# Altium schematic symbol library FPGA_Xilinx_Virtex6.SchLib: 28 symbols (part 14 of 21)
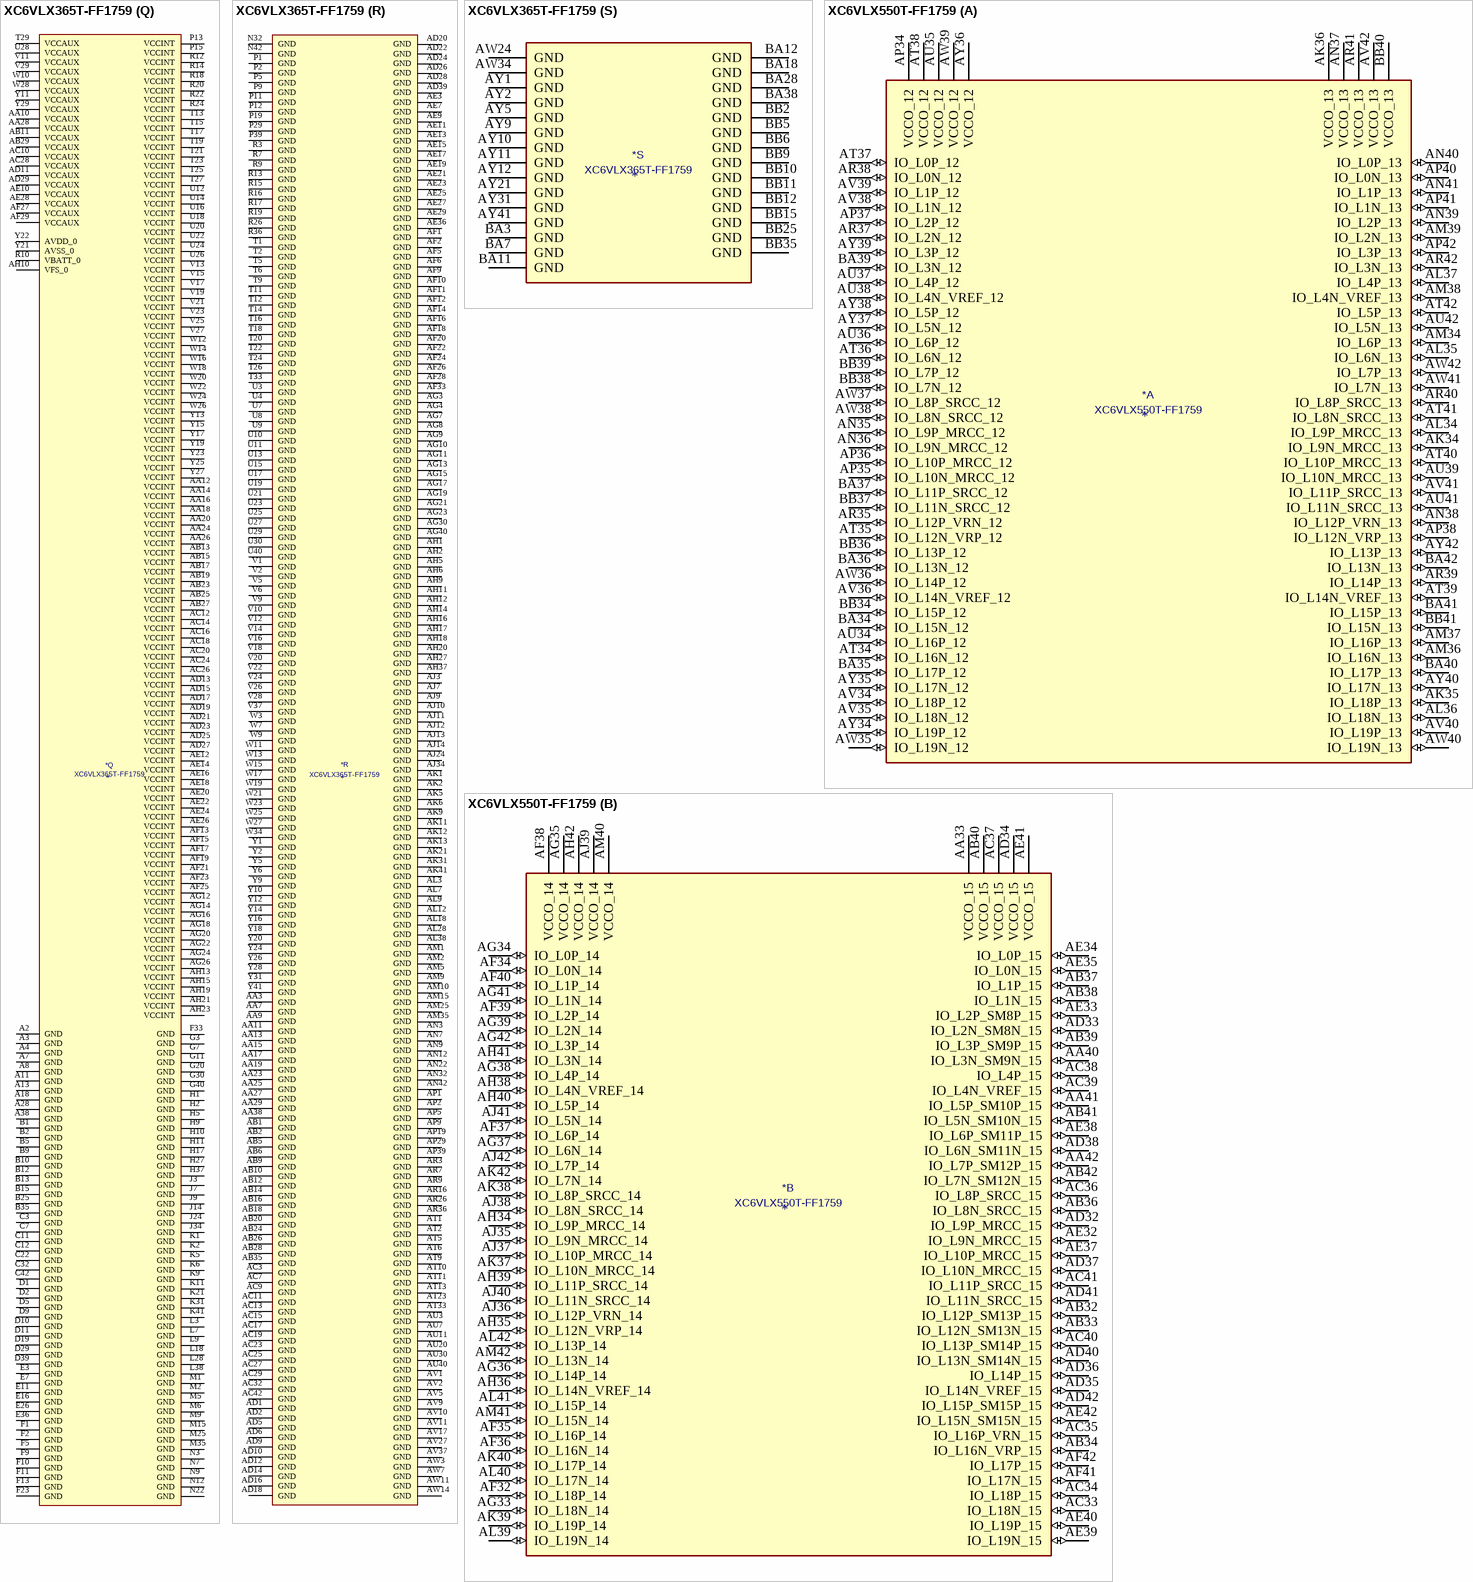
[diagram p114: symbols XC6VLX365T-FF1759 to XC6VLX550T-FF1759]

## XC6VLX365T-FF1759
designator *  value XC6VLX365T-FF1759
ki_keywords: FPGA; ki_description: Virtex 6 LXT 365 XC6VLX365T-FF1759
part A pins: AK34 IO_L9N_MRCC_13 (io), AK35 IO_L18P_13 (io), AK36 VCCO_13 (power), AL34 IO_L9P_MRCC_13 (io), AL35 IO_L6N_13 (io), AL36 IO_L18N_13 (io), AL37 IO_L4P_13 (io), AM34 IO_L6P_13 (io), AM36 IO_L16N_13 (io), AM37 IO_L16P_13 (io), AM38 IO_L4N_VREF_13 (io), AM39 IO_L2N_13 (io), AN35 IO_L9P_MRCC_12 (io), AN36 IO_L9N_MRCC_12 (io), AN37 VCCO_13 (power), AN38 IO_L12P_VRN_13 (io), AN39 IO_L2P_13 (io), AN40 IO_L0P_13 (io), AN41 IO_L1P_13 (io), AP34 VCCO_12 (power), AP35 IO_L10N_MRCC_12 (io), AP36 IO_L10P_MRCC_12 (io), AP37 IO_L2P_12 (io), AP38 IO_L12N_VRP_13 (io), AP40 IO_L0N_13 (io), AP41 IO_L1N_13 (io), AP42 IO_L3P_13 (io), AR35 IO_L12P_VRN_12 (io), AR37 IO_L2N_12 (io), AR38 IO_L0N_12 (io), AR39 IO_L14P_13 (io), AR40 IO_L8P_SRCC_13 (io), AR41 VCCO_13 (power), AR42 IO_L3N_13 (io), AT34 IO_L16N_12 (io), AT35 IO_L12N_VRP_12 (io), AT36 IO_L6N_12 (io), AT37 IO_L0P_12 (io), AT38 VCCO_12 (power), AT39 IO_L14N_VREF_13 (io), AT40 IO_L10P_MRCC_13 (io), AT41 IO_L8N_SRCC_13 (io), AT42 IO_L5P_13 (io), AU34 IO_L16P_12 (io), AU35 VCCO_12 (power), AU36 IO_L6P_12 (io), AU37 IO_L4P_12 (io), AU38 IO_L4N_VREF_12 (io), AU39 IO_L10N_MRCC_13 (io), AU41 IO_L11N_SRCC_13 (io), AU42 IO_L5N_13 (io), AV34 IO_L18P_12 (io), AV35 IO_L18N_12 (io), AV36 IO_L14N_VREF_12 (io), AV38 IO_L1N_12 (io), AV39 IO_L1P_12 (io), AV40 IO_L19P_13 (io), AV41 IO_L11P_SRCC_13 (io), AV42 VCCO_13 (power), AW35 IO_L19N_12 (io), AW36 IO_L14P_12 (io), AW37 IO_L8P_SRCC_12 (io), AW38 IO_L8N_SRCC_12 (io), AW39 VCCO_12 (power), AW40 IO_L19N_13 (io), AW41 IO_L7N_13 (io), AW42 IO_L7P_13 (io), AY34 IO_L19P_12 (io), AY35 IO_L17N_12 (io), AY36 VCCO_12 (power), AY37 IO_L5N_12 (io), AY38 IO_L5P_12 (io), AY39 IO_L3P_12 (io), AY40 IO_L17N_13 (io), AY42 IO_L13P_13 (io), BA34 IO_L15N_12 (io), BA35 IO_L17P_12 (io), BA36 IO_L13N_12 (io), BA37 IO_L11P_SRCC_12 (io), BA39 IO_L3N_12 (io), BA40 IO_L17P_13 (io), BA41 IO_L15P_13 (io), BA42 IO_L13N_13 (io), BB34 IO_L15P_12 (io), BB36 IO_L13P_12 (io), BB37 IO_L11N_SRCC_12 (io), BB38 IO_L7N_12 (io), BB39 IO_L7P_12 (io), BB40 VCCO_13 (power), BB41 IO_L15N_13 (io)
part B pins: AA33 VCCO_15 (power), AA40 IO_L3N_SM9N_15 (io), AA41 IO_L5P_SM10P_15 (io), AA42 IO_L7P_SM12P_15 (io), AB32 IO_L12P_SM13P_15 (io), AB33 IO_L12N_SM13N_15 (io), AB34 IO_L16N_VRP_15 (io), AB36 IO_L8N_SRCC_15 (io), AB37 IO_L1P_15 (io), AB38 IO_L1N_15 (io), AB39 IO_L3P_SM9P_15 (io), AB40 VCCO_15 (power), AB41 IO_L5N_SM10N_15 (io), AB42 IO_L7N_SM12N_15 (io), AC33 IO_L18N_15 (io), AC34 IO_L18P_15 (io), AC35 IO_L16P_VRN_15 (io), AC36 IO_L8P_SRCC_15 (io), AC37 VCCO_15 (power), AC38 IO_L4P_15 (io), AC39 IO_L4N_VREF_15 (io), AC40 IO_L13P_SM14P_15 (io), AC41 IO_L11P_SRCC_15 (io), AD32 IO_L9P_MRCC_15 (io), AD33 IO_L2N_SM8N_15 (io), AD34 VCCO_15 (power), AD35 IO_L14N_VREF_15 (io), AD36 IO_L14P_15 (io), AD37 IO_L10N_MRCC_15 (io), AD38 IO_L6N_SM11N_15 (io), AD40 IO_L13N_SM14N_15 (io), AD41 IO_L11N_SRCC_15 (io), AD42 IO_L15P_SM15P_15 (io), AE32 IO_L9N_MRCC_15 (io), AE33 IO_L2P_SM8P_15 (io), AE34 IO_L0P_15 (io), AE35 IO_L0N_15 (io), AE37 IO_L10P_MRCC_15 (io), AE38 IO_L6P_SM11P_15 (io), AE39 IO_L19N_15 (io), AE40 IO_L19P_15 (io), AE41 VCCO_15 (power), AE42 IO_L15N_SM15N_15 (io), AF32 IO_L18P_14 (io), AF34 IO_L0N_14 (io), AF35 IO_L16P_14 (io), AF36 IO_L16N_14 (io), AF37 IO_L6P_14 (io), AF38 VCCO_14 (power), AF39 IO_L2P_14 (io), AF40 IO_L1P_14 (io), AF41 IO_L17N_15 (io), AF42 IO_L17P_15 (io), AG33 IO_L18N_14 (io), AG34 IO_L0P_14 (io), AG35 VCCO_14 (power), AG36 IO_L14P_14 (io), AG37 IO_L6N_14 (io), AG38 IO_L4P_14 (io), AG39 IO_L2N_14 (io), AG41 IO_L1N_14 (io), AG42 IO_L3P_14 (io), AH34 IO_L9P_MRCC_14 (io), AH35 IO_L12N_VRP_14 (io), AH36 IO_L14N_VREF_14 (io), AH38 IO_L4N_VREF_14 (io), AH39 IO_L11P_SRCC_14 (io), AH40 IO_L5P_14 (io), AH41 IO_L3N_14 (io), AH42 VCCO_14 (power), AJ35 IO_L9N_MRCC_14 (io), AJ36 IO_L12P_VRN_14 (io), AJ37 IO_L10P_MRCC_14 (io), AJ38 IO_L8N_SRCC_14 (io), AJ39 VCCO_14 (power), AJ40 IO_L11N_SRCC_14 (io), AJ41 IO_L5N_14 (io), AJ42 IO_L7P_14 (io), AK37 IO_L10N_MRCC_14 (io), AK38 IO_L8P_SRCC_14 (io), AK39 IO_L19P_14 (io), AK40 IO_L17P_14 (io), AK42 IO_L7N_14 (io), AL39 IO_L19N_14 (io), AL40 IO_L17N_14 (io), AL41 IO_L15P_14 (io), AL42 IO_L13P_14 (io), AM40 VCCO_14 (power), AM41 IO_L15N_14 (io), AM42 IO_L13N_14 (io)
part C pins: AA32 IO_L12P_VRN_16 (io), AA34 IO_L14P_16 (io), AA35 IO_L8P_SRCC_16 (io), AA36 IO_L4P_16 (io), AA37 IO_L4N_VREF_16 (io), AA39 IO_L19N_16 (io), L39 IO_L1P_17 (io), L40 IO_L1N_17 (io), L41 IO_L3P_17 (io), L42 IO_L3N_17 (io), M36 IO_L0P_17 (io), M37 IO_L0N_17 (io), M38 IO_L2P_17 (io), M39 IO_L2N_17 (io), M40 VCCO_17 (power), M41 IO_L7P_17 (io), M42 IO_L7N_17 (io), N34 IO_L4N_VREF_17 (io), N35 IO_L4P_17 (io), N36 IO_L6P_17 (io), N37 VCCO_17 (power), N38 IO_L5P_17 (io), N39 IO_L5N_17 (io), N40 IO_L11P_SRCC_17 (io), N41 IO_L11N_SRCC_17 (io), P34 VCCO_17 (power), P35 IO_L9N_MRCC_17 (io), P36 IO_L9P_MRCC_17 (io), P37 IO_L6N_17 (io), P38 IO_L8N_SRCC_17 (io), P40 IO_L13P_17 (io), P41 IO_L13N_17 (io), P42 IO_L15P_17 (io), R34 IO_L14N_VREF_17 (io), R35 IO_L14P_17 (io), R37 IO_L12P_VRN_17 (io), R38 IO_L10N_MRCC_17 (io), R39 IO_L8P_SRCC_17 (io), R40 IO_L17P_17 (io), R41 VCCO_17 (power), R42 IO_L15N_17 (io), T34 IO_L18P_17 (io), T35 IO_L18N_17 (io), T36 IO_L16N_17 (io), T37 IO_L12N_VRP_17 (io), T38 VCCO_17 (power), T39 IO_L10P_MRCC_17 (io), T40 IO_L17N_17 (io), T41 IO_L19P_17 (io), T42 IO_L19N_17 (io), U32 IO_L16P_16 (io), U33 IO_L16N_16 (io), U34 IO_L10N_MRCC_16 (io), U35 VCCO_16 (power), U36 IO_L16P_17 (io), U37 IO_L1P_16 (io), U38 IO_L1N_16 (io), U39 IO_L5P_16 (io), U41 IO_L3N_16 (io), U42 IO_L3P_16 (io), V32 VCCO_16 (power), V33 IO_L18P_16 (io), V34 IO_L10P_MRCC_16 (io), V35 IO_L6N_16 (io), V36 IO_L2N_16 (io), V38 IO_L7P_16 (io), V39 IO_L5N_16 (io), V40 IO_L11P_SRCC_16 (io), V41 IO_L13P_16 (io), V42 VCCO_16 (power), W32 IO_L9P_MRCC_16 (io), W33 IO_L18N_16 (io), W35 IO_L6P_16 (io), W36 IO_L2P_16 (io), W37 IO_L0P_16 (io), W38 IO_L7N_16 (io), W39 VCCO_16 (power), W40 IO_L11N_SRCC_16 (io), W41 IO_L13N_16 (io), W42 IO_L15P_16 (io), Y32 IO_L12N_VRP_16 (io), Y33 IO_L9N_MRCC_16 (io), Y34 IO_L14N_VREF_16 (io), Y35 IO_L8N_SRCC_16 (io), Y36 VCCO_16 (power), Y37 IO_L0N_16 (io), Y38 IO_L19P_16 (io), Y39 IO_L17N_16 (io), Y40 IO_L17P_16 (io), Y42 IO_L15N_16 (io)
part D pins: AH22 VCCO_21 (power), AL23 VCCO_21 (power), AL26 IO_L9N_MRCC_22 (io), AM26 IO_L9P_MRCC_22 (io), AM27 IO_L10N_MRCC_22 (io), AN26 IO_L1P_22 (io), AN27 VCCO_22 (power), AN28 IO_L10P_MRCC_22 (io), AP24 VCCO_21 (power), AP27 IO_L1N_22 (io), AP28 IO_L3N_22 (io), AR27 IO_L11P_SRCC_22 (io), AR28 IO_L3P_22 (io), AR29 IO_L5N_22 (io), AR30 IO_L7N_22 (io), AT27 IO_L11N_SRCC_22 (io), AT28 VCCO_22 (power), AT29 IO_L5P_22 (io), AT30 IO_L7P_22 (io), AT31 IO_L13P_22 (io), AU25 VCCO_21 (power), AU28 IO_L17P_22 (io), AU29 IO_L15P_22 (io), AU31 IO_L13N_22 (io), AV28 IO_L17N_22 (io), AV29 IO_L15N_22 (io), AV30 IO_L0N_22 (io), AV31 IO_L2N_22 (io), AW28 IO_L19P_22 (io), AW29 VCCO_22 (power), AW30 IO_L0P_22 (io), AW31 IO_L2P_22 (io), AW32 IO_L4N_VREF_22 (io), AY26 VCCO_21 (power), AY28 IO_L19N_22 (io), AY29 IO_L12P_VRN_22 (io), AY30 IO_L8N_SRCC_22 (io), AY32 IO_L4P_22 (io), AY33 IO_L6N_22 (io), BA29 IO_L12N_VRP_22 (io), BA30 IO_L8P_SRCC_22 (io), BA31 IO_L16P_22 (io), BA32 IO_L6P_22 (io), BA33 VCCO_22 (power), BB28 IO_L18N_22 (io), BB29 IO_L18P_22 (io), BB30 VCCO_22 (power), BB31 IO_L16N_22 (io), BB32 IO_L14N_VREF_22 (io), BB33 IO_L14P_22 (io)
part E pins: AA30 IO_L9N_MRCC_24 (io), AA31 IO_L10P_MRCC_24 (io), AB30 VCCO_24 (power), AB31 IO_L10N_MRCC_24 (io), AC30 IO_L17N_VRP_24 (io), AC31 IO_L17P_VRN_24 (io), AD30 IO_L19N_24 (io), AD31 IO_L19P_24 (io), AE30 IO_L0P_GC_24 (io), AE31 VCCO_24 (power), AF30 IO_L0N_GC_24 (io), AF31 IO_L2N_D14_24 (io), AG25 VCCO_23 (power), AG27 IO_L14N_VREF_23 (io), AG28 IO_L14P_23 (io), AG29 IO_L18N_24 (io), AG31 IO_L4N_VREF_D10_24 (io), AG32 IO_L2P_D15_24 (io), AH24 IO_L10P_MRCC_23 (io), AH25 IO_L10N_MRCC_23 (io), AH26 IO_L18N_23 (io), AH28 IO_L12P_VRN_23 (io), AH29 IO_L18P_24 (io), AH30 IO_L14P_FCS_B_24 (io), AH31 IO_L4P_D11_24 (io), AH32 VCCO_24 (power), AH33 IO_L6N_D6_24 (io), AJ25 IO_L9P_MRCC_23 (io), AJ26 IO_L18P_23 (io), AJ27 IO_L16N_23 (io), AJ28 IO_L12N_VRP_23 (io), AJ29 VCCO_24 (power), AJ30 IO_L14N_VREF_FOE_B_MOSI_24 (io), AJ31 IO_L16P_RS0_24 (io), AJ32 IO_L8N_SRCC_24 (io), AJ33 IO_L6P_D7_24 (io), AK25 IO_L9N_MRCC_23 (io), AK26 VCCO_23 (power), AK27 IO_L16P_23 (io), AK28 IO_L8P_SRCC_23 (io), AK29 IO_L8N_SRCC_23 (io), AK30 IO_L16N_CSO_B_24 (io), AK32 IO_L12P_D3_24 (io), AK33 IO_L8P_SRCC_24 (io), AL27 IO_L6P_23 (io), AL29 IO_L2P_23 (io), AL30 IO_L2N_23 (io), AL31 IO_L1N_23 (io), AL32 IO_L12N_D2_FS2_24 (io), AL33 VCCO_23 (power), AM28 IO_L6N_23 (io), AM29 IO_L4N_VREF_23 (io), AM30 VCCO_23 (power), AM31 IO_L1P_23 (io), AM32 IO_L3N_23 (io), AM33 IO_L3P_23 (io), AN29 IO_L4P_23 (io), AN30 IO_L0N_23 (io), AN31 IO_L7N_23 (io), AN33 IO_L5P_23 (io), AN34 IO_L5N_23 (io), AP30 IO_L0P_23 (io), AP31 IO_L7P_23 (io), AP32 IO_L13P_23 (io), AP33 IO_L11N_SRCC_23 (io), AR31 VCCO_23 (power), AR32 IO_L13N_23 (io), AR33 IO_L15P_23 (io), AR34 IO_L11P_SRCC_23 (io), AT32 IO_L15N_23 (io), AU32 IO_L17N_23 (io), AU33 IO_L17P_23 (io), AV32 VCCO_23 (power), AV33 IO_L19P_23 (io), AW33 IO_L19N_23 (io), N33 IO_L5P_D9_24 (io), P32 IO_L7P_D5_24 (io), P33 IO_L5N_D8_24 (io), R30 IO_L3N_D12_24 (io), R31 VCCO_24 (power), R32 IO_L11P_SRCC_24 (io), R33 IO_L7N_D4_24 (io), T30 IO_L3P_D13_24 (io), T31 IO_L13P_D1_FS1_24 (io), T32 IO_L11N_SRCC_24 (io), U31 IO_L13N_D0_FS0_24 (io), V30 IO_L1N_GC_24 (io), V31 IO_L15P_FWE_B_24 (io), W29 VCCO_24 (power), W30 IO_L1P_GC_24 (io), W31 IO_L15N_RS1_24 (io), Y30 IO_L9P_MRCC_24 (io)
part F pins: A37 IO_L1N_26 (io), A39 IO_L3N_26 (io), A40 IO_L7P_26 (io), A41 IO_L7N_26 (io), B37 IO_L1P_26 (io), B38 IO_L3P_26 (io), B39 IO_L5P_26 (io), B40 VCCO_26 (power), B41 IO_L11P_SRCC_26 (io), B42 IO_L11N_SRCC_26 (io), C37 VCCO_26 (power), C38 IO_L6N_26 (io), C39 IO_L5N_26 (io), C40 IO_L13P_26 (io), C41 IO_L13N_26 (io), D38 IO_L6P_26 (io), D40 IO_L17P_26 (io), D41 IO_L15N_26 (io), D42 IO_L15P_26 (io), E37 IO_L4N_VREF_26 (io), E38 IO_L8N_SRCC_26 (io), E39 IO_L8P_SRCC_26 (io), E40 IO_L17N_26 (io), E41 VCCO_26 (power), E42 IO_L19P_26 (io), F35 IO_L10P_MRCC_26 (io), F36 IO_L10N_MRCC_26 (io), F37 IO_L4P_26 (io), F38 VCCO_26 (power), F39 IO_L12P_VRN_26 (io), F40 IO_L16P_26 (io), F41 IO_L16N_26 (io), F42 IO_L19N_26 (io), G34 IO_L9P_MRCC_26 (io), G35 VCCO_26 (power), G36 IO_L0N_26 (io), G37 IO_L14P_26 (io), G38 IO_L14N_VREF_26 (io), G39 IO_L12N_VRP_26 (io), G41 IO_L18P_26 (io), G42 IO_L18N_26 (io), H34 IO_L9N_MRCC_26 (io), H35 IO_L2N_26 (io), H36 IO_L0P_26 (io), H38 IO_L6N_25 (io), H39 IO_L6P_25 (io), H40 IO_L12P_25 (io), H41 IO_L12N_25 (io), H42 VCCO_25 (power), J35 IO_L2P_26 (io), J36 IO_L4N_VREF_25 (io), J37 IO_L4P_25 (io), J38 IO_L8N_SRCC_25 (io), J39 VCCO_25 (power), J40 IO_L14P_25 (io), J41 IO_L14N_VREF_25 (io), J42 IO_L18P_GC_25 (io), K32 IO_L0N_25 (io), K33 IO_L0P_25 (io), K34 IO_L2N_25 (io), K35 IO_L2P_25 (io), K36 VCCO_25 (power), K37 IO_L11P_SRCC_25 (io), K38 IO_L8P_SRCC_25 (io), K39 IO_L16P_VRN_25 (io), K40 IO_L16N_VRP_25 (io), K42 IO_L18N_GC_25 (io), L31 IO_L3P_25 (io), L32 IO_L3N_25 (io), L33 VCCO_25 (power), L34 IO_L13P_25 (io), L35 IO_L7P_25 (io), L36 IO_L7N_25 (io), L37 IO_L11N_SRCC_25 (io), M30 VCCO_25 (power), M31 IO_L17P_25 (io), M32 IO_L15N_25 (io), M33 IO_L15P_25 (io), M34 IO_L13N_25 (io), N28 IO_L1P_25 (io), N29 IO_L5P_25 (io), N30 IO_L5N_25 (io), N31 IO_L17N_25 (io), P27 IO_L9P_MRCC_25 (io), P28 IO_L1N_25 (io), P30 IO_L19P_GC_25 (io), P31 IO_L19N_GC_25 (io), R27 IO_L9N_MRCC_25 (io), R28 IO_L10P_MRCC_25 (io), R29 IO_L10N_MRCC_25 (io), T28 VCCO_25 (power)
part G pins: A32 IO_L1P_27 (io), A33 VCCO_27 (power), A34 IO_L5P_27 (io), A35 IO_L5N_27 (io), A36 IO_L13P_27 (io), B30 VCCO_28 (power), B32 IO_L1N_27 (io), B33 IO_L3P_27 (io), B34 IO_L7P_27 (io), B36 IO_L13N_27 (io), C33 IO_L3N_27 (io), C34 IO_L7N_27 (io), C35 IO_L15P_27 (io), C36 IO_L15N_27 (io), D32 IO_L0N_27 (io), D33 IO_L11P_SRCC_27 (io), D34 VCCO_27 (power), D35 IO_L4N_VREF_27 (io), D36 IO_L19P_27 (io), D37 IO_L19N_27 (io), E31 VCCO_27 (power), E32 IO_L0P_27 (io), E33 IO_L11N_SRCC_27 (io), E34 IO_L17P_27 (io), E35 IO_L4P_27 (io), F28 VCCO_28 (power), F31 IO_L2N_27 (io), F32 IO_L2P_27 (io), F34 IO_L17N_27 (io), G31 IO_L6N_27 (io), G32 IO_L8N_SRCC_27 (io), G33 IO_L8P_SRCC_27 (io), H30 IO_L16P_27 (io), H31 IO_L6P_27 (io), H32 VCCO_27 (power), H33 IO_L12P_VRN_27 (io), J29 VCCO_27 (power), J30 IO_L16N_27 (io), J31 IO_L14N_VREF_27 (io), J32 IO_L14P_27 (io), J33 IO_L12N_VRP_27 (io), K26 VCCO_28 (power), K29 IO_L18P_27 (io), K30 IO_L18N_27 (io), L29 IO_L9P_MRCC_27 (io), L30 IO_L9N_MRCC_27 (io), M28 IO_L10P_MRCC_27 (io), M29 IO_L10N_MRCC_27 (io), N27 VCCO_28 (power), P24 VCCO_28 (power)
part H pins: AJ15 IO_L10N_MRCC_33 (io), AJ16 IO_L10P_MRCC_33 (io), AJ17 IO_L6P_33 (io), AJ18 IO_L18N_33 (io), AJ19 VCCO_32 (power), AJ20 IO_L9N_MRCC_32 (io), AJ21 IO_L9P_MRCC_32 (io), AK14 IO_L9N_MRCC_33 (io), AK15 IO_L9P_MRCC_33 (io), AK16 VCCO_33 (power), AK17 IO_L6N_33 (io), AK18 IO_L18P_33 (io), AK19 IO_L10N_MRCC_32 (io), AK20 IO_L10P_MRCC_32 (io), AL13 VCCO_33 (power), AL14 IO_L0N_33 (io), AL15 IO_L0P_33 (io), AL16 IO_L4N_VREF_33 (io), AL17 IO_L4P_33 (io), AL19 IO_L1P_32 (io), AL20 IO_L5P_32 (io), AL21 IO_L5N_32 (io), AM14 IO_L2N_33 (io), AM16 IO_L8N_SRCC_33 (io), AM17 IO_L14P_33 (io), AM18 IO_L14N_VREF_33 (io), AM19 IO_L1N_32 (io), AM20 VCCO_32 (power), AM21 IO_L11P_SRCC_32 (io), AN15 IO_L2P_33 (io), AN16 IO_L8P_SRCC_33 (io), AN17 VCCO_33 (power), AN18 IO_L16P_33 (io), AN19 IO_L16N_33 (io), AN20 IO_L7P_32 (io), AN21 IO_L11N_SRCC_32 (io), AP16 IO_L12P_VRN_33 (io), AP17 IO_L12N_VRP_33 (io), AP18 IO_L11P_SRCC_33 (io), AP20 IO_L7N_32 (io), AP21 IO_L19P_32 (io), AP22 IO_L19N_32 (io), AR17 IO_L1P_33 (io), AR18 IO_L1N_33 (io), AR19 IO_L11N_SRCC_33 (io), AR20 IO_L3N_32 (io), AR21 VCCO_32 (power), AR22 IO_L17N_32 (io), AT16 IO_L3P_33 (io), AT17 IO_L5P_33 (io), AT18 VCCO_33 (power), AT19 IO_L19N_33 (io), AT20 IO_L3P_32 (io), AT21 IO_L15N_32 (io), AT22 IO_L17P_32 (io), AU17 IO_L3N_33 (io), AU18 IO_L5N_33 (io), AU19 IO_L19P_33 (io), AU21 IO_L15P_32 (io), AU22 IO_L2N_32 (io), AV18 IO_L13P_33 (io), AV19 IO_L13N_33 (io), AV20 IO_L13P_32 (io), AV21 IO_L12P_VRN_32 (io), AV22 VCCO_32 (power), AV23 IO_L2P_32 (io), AW18 IO_L7N_33 (io), AW19 VCCO_33 (power), AW20 IO_L13N_32 (io), AW21 IO_L12N_VRP_32 (io), AW22 IO_L16P_32 (io), AW23 IO_L4P_32 (io), AY18 IO_L7P_33 (io), AY19 IO_L17N_33 (io), AY20 IO_L8P_SRCC_32 (io), AY22 IO_L16N_32 (io), AY23 IO_L4N_VREF_32 (io), AY24 IO_L0P_32 (io), BA19 IO_L17P_33 (io), BA20 IO_L8N_SRCC_32 (io), BA21 IO_L14N_VREF_32 (io), BA22 IO_L14P_32 (io), BA23 VCCO_32 (power), BA24 IO_L0N_32 (io), BB18 IO_L15P_33 (io), BB19 IO_L15N_33 (io), BB20 VCCO_33 (power), BB21 IO_L18N_32 (io), BB22 IO_L18P_32 (io), BB23 IO_L6N_32 (io), BB24 IO_L6P_32 (io)
part I pins: A14 IO_L5N_SM2N_35 (io), A15 IO_L5P_SM2P_35 (io), A16 IO_L1P_35 (io), AM12 IO_L9N_MRCC_34 (io), AM13 IO_L9P_MRCC_34 (io), AN13 IO_L10N_MRCC_34 (io), AN14 IO_L10P_MRCC_34 (io), AP11 IO_L1P_GC_34 (io), AP12 IO_L1N_GC_34 (io), AP13 IO_L5P_A09_D25_34 (io), AP14 VCCO_34 (power), AP15 IO_L17P_A19_34 (io), AR11 VCCO_34 (power), AR12 IO_L3P_A13_D29_34 (io), AR13 IO_L5N_A08_D24_34 (io), AR14 IO_L15P_A23_34 (io), AR15 IO_L17N_A18_34 (io), AT12 IO_L3N_A12_D28_34 (io), AT14 IO_L15N_A22_34 (io), AT15 IO_L19P_VRN_34 (io), AU12 IO_L7P_A05_D21_34 (io), AU13 IO_L7N_A04_D20_34 (io), AU14 IO_L4N_VREF_A10_D26_34 (io), AU15 VCCO_34 (power), AU16 IO_L19N_VRP_34 (io), AV12 VCCO_34 (power), AV13 IO_L11P_SRCC_34 (io), AV14 IO_L11N_SRCC_34 (io), AV15 IO_L4P_A11_D27_34 (io), AV16 IO_L8P_SRCC_34 (io), AW12 IO_L13P_A01_D17_34 (io), AW13 IO_L13N_A00_D16_34 (io), AW15 IO_L6N_A06_D22_34 (io), AW16 IO_L8N_SRCC_34 (io), AW17 IO_L18N_A16_34 (io), AY13 IO_L0N_GC_34 (io), AY14 IO_L0P_GC_34 (io), AY15 IO_L6P_A07_D23_34 (io), AY16 VCCO_34 (power), AY17 IO_L18P_A17_34 (io), B14 IO_L13P_SM6P_35 (io), B16 IO_L1N_35 (io), BA13 VCCO_34 (power), BA14 IO_L2N_A14_D30_34 (io), BA15 IO_L2P_A15_D31_34 (io), BA16 IO_L14P_A25_34 (io), BA17 IO_L14N_VREF_A24_34 (io), BB13 IO_L12P_A03_D19_34 (io), BB14 IO_L12N_A02_D18_34 (io), BB16 IO_L16P_A21_34 (io), BB17 IO_L16N_A20_34 (io), C13 IO_L15P_SM7P_35 (io), C14 IO_L13N_SM6N_35 (io), C15 IO_L7P_SM4P_35 (io), C16 IO_L3N_SM1N_35 (io), C17 VCCO_35 (power), D12 IO_L15N_SM7N_35 (io), D13 IO_L17P_35 (io), D14 VCCO_35 (power), D15 IO_L7N_SM4N_35 (io), D16 IO_L3P_SM1P_35 (io), E12 IO_L0N_35 (io), E13 IO_L17N_35 (io), E14 IO_L19P_GC_35 (io), E15 IO_L11P_SRCC_35 (io), F12 IO_L0P_35 (io), F14 IO_L19N_GC_35 (io), F15 IO_L11N_SRCC_35 (io), G12 IO_L6N_SM3N_35 (io), G13 IO_L4N_VREF_35 (io), G14 IO_L2N_SM0N_35 (io), G15 VCCO_35 (power), H12 VCCO_35 (power), H13 IO_L6P_SM3P_35 (io), H14 IO_L4P_35 (io), H15 IO_L2P_SM0P_35 (io), J11 IO_L8N_SRCC_35 (io), J12 IO_L8P_SRCC_35 (io), J13 IO_L12P_SM5P_35 (io), K12 IO_L16P_VRN_35 (io), K13 IO_L12N_SM5N_35 (io), K14 IO_L14P_35 (io), L11 IO_L16N_VRP_35 (io), L12 IO_L18P_GC_35 (io), L13 VCCO_35 (power), L14 IO_L14N_VREF_35 (io), M12 IO_L18N_GC_35 (io), M13 IO_L10P_MRCC_35 (io), M14 IO_L9P_MRCC_35 (io), N13 IO_L10N_MRCC_35 (io), N14 IO_L9N_MRCC_35 (io)
part J pins: A17 IO_L17P_36 (io), A19 IO_L15N_36 (io), A20 IO_L15N_37 (io), A21 IO_L13N_37 (io), A22 IO_L13P_37 (io), A23 VCCO_37 (power), A24 IO_L1N_37 (io), B17 IO_L17N_36 (io), B18 IO_L15P_36 (io), B19 IO_L7N_36 (io), B20 VCCO_36 (power), B21 IO_L15P_37 (io), B22 IO_L5N_37 (io), B23 IO_L5P_37 (io), B24 IO_L1P_37 (io), C18 IO_L13N_36 (io), C19 IO_L7P_36 (io), C20 IO_L19P_37 (io), C21 IO_L17P_37 (io), C23 IO_L3N_37 (io), C24 IO_L3P_37 (io), D17 IO_L19P_36 (io), D18 IO_L13P_36 (io), D20 IO_L19N_37 (io), D21 IO_L17N_37 (io), D22 IO_L11N_SRCC_37 (io), D23 IO_L11P_SRCC_37 (io), D24 VCCO_37 (power), E17 IO_L19N_36 (io), E18 IO_L5N_36 (io), E19 IO_L5P_36 (io), E20 IO_L12P_VRN_37 (io), E21 VCCO_37 (power), E22 IO_L4N_VREF_37 (io), E23 IO_L7N_37 (io), E24 IO_L7P_37 (io), F16 IO_L2N_36 (io), F17 IO_L11P_SRCC_36 (io), F18 VCCO_36 (power), F19 IO_L3N_36 (io), F20 IO_L12N_VRP_37 (io), F21 IO_L4P_37 (io), F22 IO_L2N_37 (io), G16 IO_L2P_36 (io), G17 IO_L11N_SRCC_36 (io), G18 IO_L1N_36 (io), G19 IO_L3P_36 (io), G21 IO_L8N_SRCC_37 (io), G22 IO_L2P_37 (io), G23 IO_L0P_37 (io), H16 IO_L4N_VREF_36 (io), H18 IO_L1P_36 (io), H19 IO_L14N_VREF_37 (io), H20 IO_L8P_SRCC_37 (io), H21 IO_L6P_37 (io), H22 VCCO_37 (power), H23 IO_L0N_37 (io), J15 IO_L14P_36 (io), J16 IO_L4P_36 (io), J17 IO_L6N_36 (io), J18 IO_L0N_36 (io), J19 VCCO_37 (power), J20 IO_L14P_37 (io), J21 IO_L6N_37 (io), J22 IO_L10P_MRCC_37 (io), K15 IO_L14N_VREF_36 (io), K16 VCCO_36 (power), K17 IO_L6P_36 (io), K18 IO_L0P_36 (io), K19 IO_L18P_37 (io), K20 IO_L16P_37 (io), K22 IO_L10N_MRCC_37 (io), L15 IO_L16N_36 (io), L16 IO_L16P_36 (io), L17 IO_L12P_VRN_36 (io), L19 IO_L18N_37 (io), L20 IO_L16N_37 (io), L21 IO_L9N_MRCC_37 (io), L22 IO_L9P_MRCC_37 (io), M16 IO_L18P_36 (io), M17 IO_L12N_VRP_36 (io), M18 IO_L8P_SRCC_36 (io), N15 IO_L18N_36 (io), N16 IO_L10P_MRCC_36 (io), N17 VCCO_36 (power), N18 IO_L8N_SRCC_36 (io), P14 VCCO_36 (power), P16 IO_L10N_MRCC_36 (io), P17 IO_L9N_MRCC_36 (io), P18 IO_L9P_MRCC_36 (io)
part K pins: C27 VCCO_38 (power), G25 VCCO_38 (power), L23 VCCO_38 (power), M20 VCCO_38 (power), R21 VCCO_38 (power)
part L pins: AD3 MGTRXP3_113 (io), AD4 MGTRXN3_113 (io), AD7 MGTREFCLK1N_113 (io), AD8 MGTREFCLK1P_113 (io), AE5 MGTRXP2_113 (io), AE6 MGTRXN2_113 (io), AF3 MGTRXP1_113 (io), AF4 MGTRXN1_113 (io), AF7 MGTREFCLK0N_113 (io), AF8 MGTREFCLK0P_113 (io), AG1 MGTTXP3_113 (io), AG2 MGTTXN3_113 (io), AG5 MGTRXP0_113 (io), AG6 MGTRXN0_113 (io), AH3 MGTTXP2_113 (io), AH4 MGTTXN2_113 (io), AH7 MGTREFCLK1N_112 (io), AH8 MGTREFCLK1P_112 (io), AJ1 MGTTXP1_113 (io), AJ2 MGTTXN1_113 (io), AJ5 MGTRXP3_112 (io), AJ6 MGTRXN3_112 (io), AK3 MGTTXP0_113 (io), AK4 MGTTXN0_113 (io), AK7 MGTREFCLK0N_112 (io), AK8 MGTREFCLK0P_112 (io), AL1 MGTTXP3_112 (io), AL2 MGTTXN3_112 (io), AL5 MGTRXP2_112 (io), AL6 MGTRXN2_112 (io), AM3 MGTTXP2_112 (io), AM4 MGTTXN2_112 (io), AM7 MGTRXP1_112 (io), AM8 MGTRXN1_112 (io), AN1 MGTTXP1_112 (io), AN2 MGTTXN1_112 (io), AN5 MGTRXP0_112 (io), AN6 MGTRXN0_112 (io), AP3 MGTTXP0_112 (io), AP4 MGTTXN0_112 (io)
part M pins: AA1 MGTTXP2_114 (io), AA2 MGTTXN2_114 (io), AA5 MGTRXP2_114 (io), AA6 MGTRXN2_114 (io), AB3 MGTRXP1_114 (io), AB4 MGTRXN1_114 (io), AB7 MGTREFCLK0N_114 (io), AB8 MGTREFCLK0P_114 (io), AC1 MGTTXP1_114 (io), AC2 MGTTXN1_114 (io), AC5 MGTRXP0_114 (io), AC6 MGTRXN0_114 (io), AE1 MGTTXP0_114 (io), AE2 MGTTXN0_114 (io), P3 MGTTXP3_115 (io), P4 MGTTXN3_115 (io), R1 MGTTXP2_115 (io), R2 MGTTXN2_115 (io), R5 MGTRXP3_115 (io), R6 MGTRXN3_115 (io), T3 MGTTXP1_115 (io), T4 MGTTXN1_115 (io), T7 MGTREFCLK1N_115 (io), T8 MGTREFCLK1P_115 (io), U1 MGTTXP0_115 (io), U2 MGTTXN0_115 (io), U5 MGTRXP2_115 (io), U6 MGTRXN2_115 (io), V3 MGTRXP1_115 (io), V4 MGTRXN1_115 (io), V7 MGTREFCLK0N_115 (io), V8 MGTREFCLK0P_115 (io), W1 MGTTXP3_114 (io), W2 MGTTXN3_114 (io), W5 MGTRXP0_115 (io), W6 MGTRXN0_115 (io), Y3 MGTRXP3_114 (io), Y4 MGTRXN3_114 (io), Y7 MGTREFCLK1N_114 (io), Y8 MGTREFCLK1P_114 (io)
part N pins: E5 MGTRXP3_117 (io), E6 MGTRXN3_117 (io), E9 MGTREFCLK1N_117 (io), E10 MGTREFCLK1P_117 (io), F3 MGTTXP3_117 (io), F4 MGTTXN3_117 (io), F7 MGTRXP2_117 (io), F8 MGTRXN2_117 (io), G1 MGTTXP2_117 (io), G2 MGTTXN2_117 (io), G5 MGTRXP1_117 (io), G6 MGTRXN1_117 (io), G9 MGTREFCLK0N_117 (io), G10 MGTREFCLK0P_117 (io), H3 MGTTXP1_117 (io), H4 MGTTXN1_117 (io), H7 MGTRXP0_117 (io), H8 MGTRXN0_117 (io), J1 MGTTXP0_117 (io), J2 MGTTXN0_117 (io), J5 MGTRXP3_116 (io), J6 MGTRXN3_116 (io), K3 MGTTXP3_116 (io), K4 MGTTXN3_116 (io), K7 MGTREFCLK1N_116 (io), K8 MGTREFCLK1P_116 (io), L1 MGTTXP2_116 (io), L2 MGTTXN2_116 (io), L5 MGTRXP2_116 (io), L6 MGTRXN2_116 (io), M3 MGTTXP1_116 (io), M4 MGTTXN1_116 (io), M7 MGTREFCLK0N_116 (io), M8 MGTREFCLK0P_116 (io), N1 MGTTXP0_116 (io), N2 MGTTXN0_116 (io), N5 MGTRXP1_116 (io), N6 MGTRXN1_116 (io), P7 MGTRXP0_116 (io), P8 MGTRXN0_116 (io)
part O pins: A12 MGTAVTTRCAL_115 (power), AA4 MGTAVTT_S (power), AA8 MGTAVCC_N (power), AC4 MGTAVTT_S (power), AC8 MGTAVCC_S (power), AE4 MGTAVTT_S (power), AE8 MGTAVCC_S (power), AJ4 MGTAVTT_S (power), AJ8 MGTAVCC_S (power), AL4 MGTAVTT_S (power), AL8 MGTAVCC_S (power), AM6 MGTAVTT_S (power), AN4 MGTAVTT_S (power), AN8 MGTAVCC_S (power), AP6 MGTAVTT_S (power), AR4 MGTAVTT_S (power), AR8 MGTAVCC_S (power), AU4 MGTAVTT_S (power), AU8 MGTAVCC_S (power), AV6 MGTAVTT_S (power), AW4 MGTAVTT_S (power), AW8 MGTAVCC_S (power), AY6 MGTAVTT_S (power), B6 MGTAVTT_N (power), B11 MGTRREF_115 (power), BA4 MGTAVTT_S (power), BA8 MGTAVCC_S (power), C4 MGTAVTT_N (power), C8 MGTAVCC_N (power), D6 MGTAVTT_N (power), E4 MGTAVTT_N (power), E8 MGTAVCC_N (power), F6 MGTAVTT_N (power), G4 MGTAVTT_N (power), G8 MGTAVCC_N (power), H6 MGTAVTT_N (power), J4 MGTAVTT_N (power), J8 MGTAVCC_N (power), L4 MGTAVTT_N (power), L8 MGTAVCC_N (power), N4 MGTAVTT_N (power), N8 MGTAVCC_N (power), P6 MGTAVTT_N (power), R4 MGTAVTT_N (power), R8 MGTAVCC_N (power), W4 MGTAVTT_N (power), W8 MGTAVCC_N (power)